# Altium footprint library LimeMicroAltiumLib_pcbLib_r05.PcbLib: 746 footprints (part 10 of 48)
Each footprint in its own frame and in the unit in brackets; x right, y up, seen from the top. Pads: shape width x height; smd on the part's side, far side on the other; paste and mask are expansions set on the pad; w line width, h text height; cw(c..) or ccw(c..) is an arc to the next point about the centre after c.
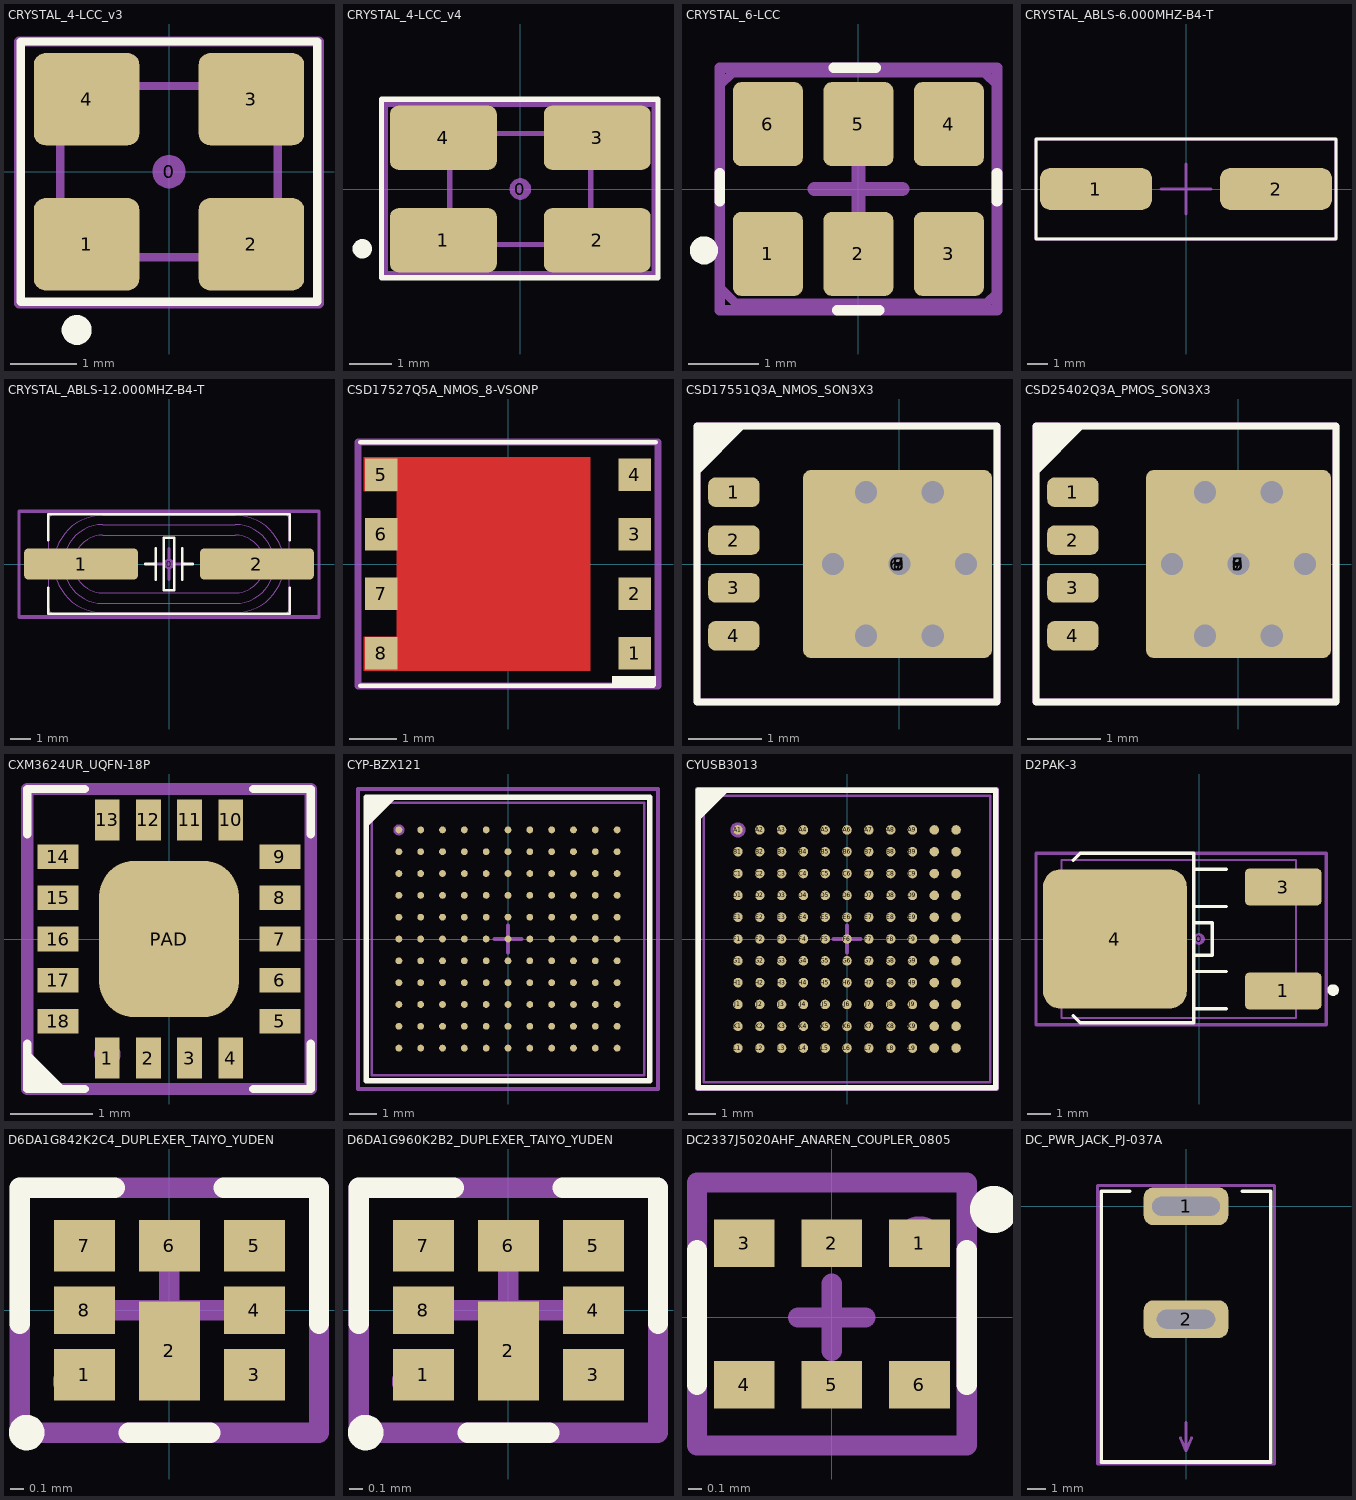
[diagram p9: the footprints below, top view; thin cyan lines are the x and y axes]

## CRYSTAL_4-LCC_v3 [mm] "SMD Crystal 4-lead leadless package"
height 0.8
pads (5):
  round 0.508 on Mech15: 0(0,0)
  rrect25% 1.6x1.4 smd: 1(-1.25,-1.1) 2(1.25,-1.1) 3(1.25,1.1) 4(-1.25,1.1)
Top Overlay:
  circle w0.254: c-1.4,-2.4 r0.1
  lines w0.127: -2.25,-1.975 2.25,-1.975 2.25,1.975 -2.25,1.975 -2.25,-1.975
Mechanical 13:
  lines w0.127: -1.65,-1.143 -1.65,1.143 -1.493,1.3 1.494,1.3 1.65,1.144 1.65,-1.143 1.493,-1.3 -1.493,-1.3 -1.65,-1.143
Mechanical 15:
  circle w0.35: c-1.5,-1.3 r0.141
  lines w0.15: -2.275,-2 -2.275,1.975 2.275,1.975 2.275,-2 -2.275,-2
  text ".Designator" at 0,0 h0.55
3D body "Crystal TXC Corp 7M series.STEP": height 0.8, standoff 0, extent -1.65,-1.3 1.65,1.3

## CRYSTAL_4-LCC_v4 [mm] "SMD Crystal 4-lead leadless package"
height 0.8
pads (5):
  round 0.508 on Mech15: 0(0,0)
  rrect25% 2.5x1.5 smd: 1(-1.8,-1.2) 2(1.8,-1.2) 3(1.8,1.2) 4(-1.8,1.2)
Top Overlay:
  circle w0.254: c-3.7,-1.4 r0.1
  lines w0.127: -3.25,-2.075 -3.25,2.1 3.225,2.1 3.225,-2.075 -3.25,-2.075
Mechanical 13:
  lines w0.127: -1.65,-1.143 -1.493,-1.3 1.493,-1.3 1.65,-1.143 1.65,1.144 1.494,1.3 -1.493,1.3 -1.65,1.143 -1.65,-1.143
Mechanical 15:
  circle w0.35: c-2.2,-1.3 r0.141
  lines w0.15: -3.175,-2 3.15,-2 3.15,2 -3.175,2 -3.175,-2
  text ".Designator" at 0,0 h0.55
3D body "User Library-Crystal.step": height 0.9, standoff -0.05, extent -2.5,-1.6 2.5,1.6

## CRYSTAL_6-LCC [mm] "SMD Crystal 6-lead leadless package"
height 0.8
pads (6):
  rrect25% 1x1.2 smd: 1(-1.29,-0.925) 2(0,-0.925) 3(1.29,-0.925) 4(1.29,0.925) 5(0,0.925) 6(-1.29,0.925)
Top Overlay:
  circle w0.2: c-2.2,-0.875 r0.1
  lines w0.15: -1.975,-0.175 -1.975,0.225 ; -0.35,1.725 0.25,1.725 ; -0.3,-1.725 0.3,-1.725 ; 1.975,-0.175 1.975,0.225
Mechanical 13:
  lines w0.127: -1.975,-1.4 -1.75,-1.625 1.825,-1.625 1.975,-1.475 1.975,1.475 1.8,1.65 -1.8,1.65 -1.975,1.475 -1.975,-1.4
Mechanical 15:
  lines w0.15: -1.975,-1.725 1.975,-1.725 1.975,1.725 -1.975,1.725 -1.975,-1.725
  lines w0.2: -0.625,0 0,0 ; 0,-0.625 0,0 ; 0,0.625 0,0 ; 0.625,0 0,0
  lines w0.3: -1.185,-0.907 ccw(c-1.279,-0.922) -1.184,-0.925
  text ".Designator" at 0,0 h0.55
3D body "User Library-SG310.SLDPRT": height 1.05, standoff 0, extent -1.6,-1.225 1.6,1.275

## CRYSTAL_ABLS-6.000MHZ-B4-T [mm]
pads (2):
  rrect50% 5.6x2.1 smd mask+0.05: 1(-4.5,0) 2(4.5,0)
Top Overlay:
  lines w0.15: -7.5,-2.5 7.5,-2.5 7.5,2.5 -7.5,2.5 -7.5,-2.5
Mechanical 15:
  lines w0.15: -1.25,0 0,0 ; 0,-1.25 0,0 ; 0,1.25 0,0 ; 1.25,0 0,0 ; -7.5,-2.5 7.5,-2.5 7.5,2.5 -7.5,2.5 -7.5,-2.5
  text ".Designator" at 0,0 h0.55
3D body "ABLS-6.000MHZ-B4-T--3DModel-STEP-400430.STEP": height 4.06, standoff -0.1, extent -6.35,-2.349 6.35,2.35

## CRYSTAL_ABLS-12.000MHZ-B4-T [mm] "SMD Crystal ABLS-12.000MHZ-B4-T package"
height 4.3
pads (3):
  round 0.508 on Mech14: 0(0,0)
  rrect25% 5.5x1.5 smd: 1(-4.25,0) 2(4.25,0)
Top Overlay:
  lines w0.127: -5.842,-1.143 -5.842,-2.413 5.842,-2.413 5.842,-1.143 ; -5.842,1.143 -5.842,2.413 5.842,2.413 5.842,1.143 ; -1.143,0 -0.635,0 ; -0.635,-0.762 -0.635,0.762 ; 0.635,-0.762 0.635,0.762 ; 0.635,0 1.143,0 ; -0.254,-1.27 0.254,-1.27 0.254,1.27 -0.254,1.27 -0.254,-1.27
Mechanical 13:
  lines w0.05: -5.8,-0.45 -6.4,-0.45 -6.4,0.45 -5.8,0.45 ; 5.8,-0.45 6.4,-0.45 6.4,0.45 5.8,0.45 ; -5.8,-2.165 ccw(c-5.55,-2.165) -5.55,-2.415 5.55,-2.415 ccw(c5.55,-2.165) 5.8,-2.165 5.8,2.165 ccw(c5.55,2.165) 5.55,2.415 -5.55,2.415 ccw(c-5.55,2.165) -5.8,2.165 -5.8,-2.165 ; -3.2,-2.35 cw(c-3.2,0) -3.2,2.35 3.2,2.35 cw(c3.2,0) 3.2,-2.35 -3.2,-2.35 ; -3.2,-1.9 cw(c-3.2,0) -3.2,1.9 3.2,1.9 cw(c3.2,0) 3.2,-1.9 -3.2,-1.9 ; -3.2,-1.4 cw(c-3.2,0) -3.2,1.4 3.2,1.4 cw(c3.2,0) 3.2,-1.4 -3.2,-1.4
Mechanical 14:
  lines w0.127: -7.239,-2.54 7.239,-2.54 7.239,2.54 -7.239,2.54 -7.239,-2.54
Mechanical 15:
  lines w0.15: -0.75,0 0,0 ; 0,-0.75 0,0 ; 0,0.75 0,0 ; 0.75,0 0,0 ; -7.25,-2.575 -7.25,2.55 7.25,2.55 7.25,-2.575 -7.25,-2.575
  text ".Designator" at 0,0 h0.55
3D body "Crystal HC49_US-SM.STEP": height 4.29, standoff -0.01, extent -6.4,-2.415 6.4,2.415

## CSD17527Q5A_NMOS_8-VSONP [mm]
height 1.7
pads (8):
  rect 0.7x0.7 smd: 1(2.705,-1.905) 2(2.705,-0.635) 3(2.705,0.635) 4(2.705,1.905) 5(-2.705,1.905) 6(-2.705,0.635) 7(-2.705,-0.635) 8(-2.705,-1.905)
Top Layer:
  region: -3.075,-1.55 -2.375,-1.55 -2.375,1.55 -3.075,1.55 -3.075,2.275 1.75,2.275 1.75,-2.275 -3.075,-2.275
Top Overlay:
  region: 3.15,-2.6 3.15,-2.4 2.225,-2.4 2.225,-2.6
  lines w0.1: -3.15,-2.6 3.1,-2.6 ; -3.15,2.6 3.15,2.6
Top Paste:
  region: -1.8,1.775 -1.8,0.275 -0.3,0.275 -0.3,1.775
  region: -1.8,-1.775 -1.8,-0.275 -0.3,-0.275 -0.3,-1.775
  region: 0.1,1.775 1.3,1.775 1.3,0.275 0.1,0.275
  region: 0.1,-1.775 1.3,-1.775 1.3,-0.275 0.1,-0.275
Top Solder:
  region: 1.85,-2.35 1.85,2.35 -2.45,2.35 -2.45,-2.35
Mechanical 15:
  circle w0.15: c2.7,-1.9 r0.075
  lines w0.15: -0.5,0 0.5,0 ; 0,-0.5 0,0.5 ; -3.2,-2.6 -3.2,2.6 3.2,2.6 3.2,-2.6 -3.2,-2.6
  text ".Designator" at 0,0 h0.55
3D body "User Library-VSON-8.step": height 1, standoff 0, extent -3.002,-2.5 3,2.5

## CSD17551Q3A_NMOS_SON3X3 [mm]
pads (9):
  rrect50% 0.7x0.4 smd paste-1000 mask+0.05: 1(-2.248,0.975) 2(-2.248,0.325) 3(-2.248,-0.325) 4(-2.248,-0.975)
  rrect8% 2.51x2.55 smd paste-1000 mask+0.05: 5(0,0) 6(-0.053,0) 7(0,0) 8(0,0) 9(0,0)
via -0.453,0.975 diameter 0.6 hole 0.3
via 0.452,0.975 diameter 0.6 hole 0.3
via -0.453,-0.975 diameter 0.6 hole 0.3
via 0.452,-0.975 diameter 0.6 hole 0.3
via -0.905,0 diameter 0.6 hole 0.3
via 0,0 diameter 0.6 hole 0.3
via 0.905,0 diameter 0.6 hole 0.3
Top Overlay:
  region: -2.75,1.875 -2.75,1.2 -2.075,1.875
  lines w0.1: -2.75,-1.875 1.325,-1.875 1.325,1.875 -2.75,1.875 -2.75,-1.875
Top Paste:
  drawing of 12 lines, arcs and shapes, not listed
Top Solder:
  drawing of 5 lines, arcs and shapes, not listed
Mechanical 15:
  circle w0.15: c-2.275,0.975 r0.056
  lines w0.1: -0.5,0 0,0 ; 0,-0.5 0,0 ; 0,0.5 0,0 ; 0.5,0 0,0 ; -2.75,-1.875 -2.75,1.875 1.325,1.875 1.325,-1.875 -2.75,-1.875
  text ".Designator" at 0,0 h0.55
3D body "Trans_Texas_Instruments_CSD17551Q3A_eec.STEP": height 0.25, standoff 0, extent -2.698,-1.875 1.302,1.875

## CSD25402Q3A_PMOS_SON3X3 [mm]
pads (9):
  rrect50% 0.7x0.4 smd paste-1000 mask+0.05: 1(-2.248,0.975) 2(-2.248,0.325) 3(-2.248,-0.325) 4(-2.248,-0.975)
  rrect8% 2.51x2.55 smd paste-1000 mask+0.05: 5(0,0) 6(0,0) 7(0,0) 8(0,0) 9(0,0)
via -0.453,0.975 diameter 0.6 hole 0.3
via 0.452,0.975 diameter 0.6 hole 0.3
via -0.453,-0.975 diameter 0.6 hole 0.3
via 0.452,-0.975 diameter 0.6 hole 0.3
via -0.905,0 diameter 0.6 hole 0.3
via 0,0 diameter 0.6 hole 0.3
via 0.905,0 diameter 0.6 hole 0.3
Top Overlay:
  region: -2.75,1.875 -2.75,1.2 -2.075,1.875
  lines w0.1: -2.75,-1.875 1.325,-1.875 1.325,1.875 -2.75,1.875 -2.75,-1.875
Top Paste:
  drawing of 12 lines, arcs and shapes, not listed
Top Solder:
  drawing of 5 lines, arcs and shapes, not listed
Mechanical 15:
  circle w0.15: c-2.275,0.975 r0.056
  lines w0.1: -0.5,0 0,0 ; 0,-0.5 0,0 ; 0,0.5 0,0 ; 0.5,0 0,0 ; -2.75,-1.875 -2.75,1.875 1.325,1.875 1.325,-1.875 -2.75,-1.875
  text ".Designator" at 0,0 h0.55
3D body "Trans_Texas_Instruments_CSD17551Q3A_eec.STEP": height 0.25, standoff 0, extent -2.698,-1.875 1.302,1.875

## CXM3624UR_UQFN-18P [mm]
pads (19):
  rect 0.3x0.5 smd mask+0.05: 1(-0.75,-1.45) 2(-0.25,-1.45) 3(0.25,-1.45) 4(0.75,-1.45) 10(0.75,1.45) 11(0.25,1.45) 12(-0.25,1.45) 13(-0.75,1.45)
  rect 0.5x0.3 smd mask+0.05: 5(1.35,-1) 6(1.35,-0.5) 7(1.35,0) 8(1.35,0.5) 9(1.35,1) 14(-1.35,1) 15(-1.35,0.5) 16(-1.35,0) 17(-1.35,-0.5) 18(-1.35,-1)
  rrect50% 1.7x1.9 smd paste-0.1 mask+0.05: PAD(0,0)
Top Overlay:
  region: -1.725,-1.35 -1.25,-1.825 -1.725,-1.825
  lines w0.1: -1.725,-1.275 -1.725,-1.825 -1.025,-1.825 ; -1.725,1.275 -1.725,1.825 -1.025,1.825 ; 1.025,-1.825 1.725,-1.825 1.725,-1.275 ; 1.025,1.825 1.725,1.825 1.725,1.275
Mechanical 15:
  circle w0.25: c-0.75,-1.4 r0.035
  lines w0.15: -0.5,0 0,0 ; 0,-0.5 0,0 ; 0,0.5 0,0 ; 0.5,0 0,0 ; -1.725,-1.825 -1.725,1.825 1.725,1.825 1.725,-1.825 -1.725,-1.825
  text ".Designator" at 0,0 h0.55
3D body: height 0.56, standoff 0, extent -1.198,-1.3 -0.8,-0.9
3D body: height 0.55, standoff 0, extent -1.4,-1.5 1.4,1.5

## CYP-BZX121 [mm] "BGA, 121-Balls, Body 10x10mm, Pitch 0.8mm"
height 1.2
pads (121):
  round 0.25 smd: A1(-4,4) A2(-3.2,4) A3(-2.4,4) A4(-1.6,4) A5(-0.8,4) A6(0,4) A7(0.8,4) A8(1.6,4) A9(2.4,4) A10(3.2,4) A11(4,4) B1(-4,3.2) B2(-3.2,3.2) B3(-2.4,3.2) B4(-1.6,3.2) B5(-0.8,3.2) B6(0,3.2) B7(0.8,3.2) B8(1.6,3.2) B9(2.4,3.2) B10(3.2,3.2) B11(4,3.2) C1(-4,2.4) C2(-3.2,2.4) C3(-2.4,2.4) C4(-1.6,2.4) C5(-0.8,2.4) C6(0,2.4) C7(0.8,2.4) C8(1.6,2.4) C9(2.4,2.4) C10(3.2,2.4) C11(4,2.4) D1(-4,1.6) D2(-3.2,1.6) D3(-2.4,1.6) D4(-1.6,1.6) D5(-0.8,1.6) D6(0,1.6) D7(0.8,1.6) D8(1.6,1.6) D9(2.4,1.6) D10(3.2,1.6) D11(4,1.6) E1(-4,0.8) E2(-3.2,0.8) E3(-2.4,0.8) E4(-1.6,0.8) E5(-0.8,0.8) E6(0,0.8) E7(0.8,0.8) E8(1.6,0.8) E9(2.4,0.8) E10(3.2,0.8) E11(4,0.8) F1(-4,0) F2(-3.2,0) F3(-2.4,0) F4(-1.6,0) F5(-0.8,0) F6(0,0) F7(0.8,0) F8(1.6,0) F9(2.4,0) F10(3.2,0) F11(4,0) G1(-4,-0.8) G2(-3.2,-0.8) G3(-2.4,-0.8) G4(-1.6,-0.8) G5(-0.8,-0.8) G6(0,-0.8) G7(0.8,-0.8) G8(1.6,-0.8) G9(2.4,-0.8) G10(3.2,-0.8) G11(4,-0.8) H1(-4,-1.6) H2(-3.2,-1.6) H3(-2.4,-1.6) H4(-1.6,-1.6) H5(-0.8,-1.6) H6(0,-1.6) H7(0.8,-1.6) H8(1.6,-1.6) H9(2.4,-1.6) H10(3.2,-1.6) H11(4,-1.6) J1(-4,-2.4) J2(-3.2,-2.4) J3(-2.4,-2.4) J4(-1.6,-2.4) J5(-0.8,-2.4) J6(0,-2.4) J7(0.8,-2.4) J8(1.6,-2.4) J9(2.4,-2.4) J10(3.2,-2.4) J11(4,-2.4) K1(-4,-3.2) K2(-3.2,-3.2) K3(-2.4,-3.2) K4(-1.6,-3.2) K5(-0.8,-3.2) K6(0,-3.2) K7(0.8,-3.2) K8(1.6,-3.2) K9(2.4,-3.2) K10(3.2,-3.2) K11(4,-3.2) L1(-4,-4) L2(-3.2,-4) L3(-2.4,-4) L4(-1.6,-4) L5(-0.8,-4) L6(0,-4) L7(0.8,-4) L8(1.6,-4) L9(2.4,-4) L10(3.2,-4) L11(4,-4)
Top Overlay:
  region: -4.2,5.2 -5.2,4.2 -5.2,5.2
  lines w0.2: -5.2,4.2 -4.2,5.2 ; -5.2,-5.2 -5.2,5.2 5.2,5.2 5.2,-5.2 -5.2,-5.2
Mechanical 13:
  lines w0.1: -5,-5 -5,5 5,5 5,-5 -5,-5
Mechanical 15:
  circle w0.2: c-4,4 r0.1
  lines w0.15: -0.5,0 0.5,0 ; 0,-0.5 0,0.5 ; -5.5,-5.5 -5.5,5.5 5.5,5.5 5.5,-5.5 -5.5,-5.5
  text ".Designator" at 0,0 h0.55
3D body: height 1.2, standoff 0.15, extent -5,-5 5,5
3D body: height 1.3, standoff 1.2, extent -4.4,3.6 -3.6,4.4

## CYUSB3013 [mm] "BGA, 121-Leads, Body 10,50x10,50mmx1,10mm, Pitch 0,80mm"
height 1.1
pads (121):
  round 0.35 smd: A1(-4,4) A2(-3.2,4) A3(-2.4,4) A4(-1.6,4) A5(-0.8,4) A6(0,4) A7(0.8,4) A8(1.6,4) A9(2.4,4) A10(3.2,4) A11(4,4) B1(-4,3.2) B2(-3.2,3.2) B3(-2.4,3.2) B4(-1.6,3.2) B5(-0.8,3.2) B6(0,3.2) B7(0.8,3.2) B8(1.6,3.2) B9(2.4,3.2) B10(3.2,3.2) B11(4,3.2) C1(-4,2.4) C2(-3.2,2.4) C3(-2.4,2.4) C4(-1.6,2.4) C5(-0.8,2.4) C6(0,2.4) C7(0.8,2.4) C8(1.6,2.4) C9(2.4,2.4) C10(3.2,2.4) C11(4,2.4) D1(-4,1.6) D2(-3.2,1.6) D3(-2.4,1.6) D4(-1.6,1.6) D5(-0.8,1.6) D6(0,1.6) D7(0.8,1.6) D8(1.6,1.6) D9(2.4,1.6) D10(3.2,1.6) D11(4,1.6) E1(-4,0.8) E2(-3.2,0.8) E3(-2.4,0.8) E4(-1.6,0.8) E5(-0.8,0.8) E6(0,0.8) E7(0.8,0.8) E8(1.6,0.8) E9(2.4,0.8) E10(3.2,0.8) E11(4,0.8) F1(-4,0) F2(-3.2,0) F3(-2.4,0) F4(-1.6,0) F5(-0.8,0) F6(0,0) F7(0.8,0) F8(1.6,0) F9(2.4,0) F10(3.2,0) F11(4,0) G1(-4,-0.8) G2(-3.2,-0.8) G3(-2.4,-0.8) G4(-1.6,-0.8) G5(-0.8,-0.8) G6(0,-0.8) G7(0.8,-0.8) G8(1.6,-0.8) G9(2.4,-0.8) G10(3.2,-0.8) G11(4,-0.8) H1(-4,-1.6) H2(-3.2,-1.6) H3(-2.4,-1.6) H4(-1.6,-1.6) H5(-0.8,-1.6) H6(0,-1.6) H7(0.8,-1.6) H8(1.6,-1.6) H9(2.4,-1.6) H10(3.2,-1.6) H11(4,-1.6) J1(-4,-2.4) J2(-3.2,-2.4) J3(-2.4,-2.4) J4(-1.6,-2.4) J5(-0.8,-2.4) J6(0,-2.4) J7(0.8,-2.4) J8(1.6,-2.4) J9(2.4,-2.4) J10(3.2,-2.4) J11(4,-2.4) K1(-4,-3.2) K2(-3.2,-3.2) K3(-2.4,-3.2) K4(-1.6,-3.2) K5(-0.8,-3.2) K6(0,-3.2) K7(0.8,-3.2) K8(1.6,-3.2) K9(2.4,-3.2) K10(3.2,-3.2) K11(4,-3.2) L1(-4,-4) L2(-3.2,-4) L3(-2.4,-4) L4(-1.6,-4) L5(-0.8,-4) L6(0,-4) L7(0.8,-4) L8(1.6,-4) L9(2.4,-4) L10(3.2,-4) L11(4,-4)
Top Overlay:
  region: -4.45,5.45 -5.45,4.45 -5.45,5.45
  lines w0.2: -5.45,4.45 -4.45,5.45 ; -5.45,-5.45 -5.45,5.45 5.45,5.45 5.45,-5.45 -5.45,-5.45
Mechanical 13:
  lines w0.1: -5.25,-5.25 -5.25,5.25 5.25,5.25 5.25,-5.25 -5.25,-5.25
Mechanical 15:
  circle w0.35: c-4,4 r0.1
  lines w0.15: -0.5,0 0.5,0 ; 0,-0.5 0,0.5 ; -5.5,-5.5 -5.5,5.5 5.5,5.5 5.5,-5.5 -5.5,-5.5
  text ".Designator" at 0,0 h0.55
3D body: height 1.11, standoff 1, extent -4.397,3.601 -3.6,4.399
3D body: height 1.1, standoff 0.25, extent -5.25,-5.25 5.25,5.25

## D2PAK-3 [mm] "D-PAK/TO-263-3; 3 Leads (1 Cropped); Body 14.7 (inc. leads) x 10.2 mm (LxW max)"
height 4.572
pads (4):
  round 0.508 on Mech15: 0(0,0)
  rrect25% 3.3x1.6 smd: 1(3.626,-2.24) 3(3.626,2.24)
  rrect25% 6.2x6 smd: 4(-3.626,0)
Top Overlay:
  circle w0.25: c5.774,-2.2 r0.125
  lines w0.15: -5.426,-3.3 -5.126,-3.6 -0.225,-3.6 -0.225,3.7 -5.126,3.7 -5.426,3.4 ; 1.174,-3 -0.226,-3 -0.226,-1.4 1.174,-1.4 ; 1.174,1.4 -0.226,1.4 -0.226,3 1.174,3 ; -0.226,-0.7 0.574,-0.7 0.574,0.7 -0.226,0.7 -0.226,-0.7
Mechanical 13:
  lines w0.076: -5.928,-3.4 -5.928,3.4 4.174,3.4 4.174,-3.4 -5.928,-3.4
Mechanical 15:
  circle w0.3: c3.674,-2.2 r0.1
  lines w0.15: -7.026,-3.7 5.474,-3.7 5.474,3.7 -7.026,3.7 -7.026,-3.7
  text ".Designator" at 0,0 h0.55
3D body "User Library-DPAK_TO-252AA.step": height 2.37, standoff -0.03, extent -5.928,-3.367 4.172,3.367

## D6DA1G842K2C4_DUPLEXER_TAIYO_YUDEN [mm]
pads (8):
  rect 0.45x0.38 smd mask+0.05: 1(-0.625,-0.475) 3(0.625,-0.475) 5(0.625,0.475) 6(0,0.475) 7(-0.625,0.475)
  rect 0.45x0.73 smd mask+0.05: 2(0,-0.3)
  rect 0.45x0.35 smd mask+0.05: 4(0.625,0) 8(-0.625,0)
Top Overlay:
  circle w0.15: c-1.05,-0.9 r0.056
  lines w0.15: -1.1,-0.1 -1.1,0.9 -0.4,0.9 ; -0.3,-0.9 0.3,-0.9 ; 0.4,0.9 1.1,0.9 1.1,-0.1
Top Solder:
  region: -0.9,0.715 -0.9,-0.715 0.9,-0.715 0.9,0.715
Mechanical 13:
  region: -0.15,-0.6 -0.15,-0.025 0.15,-0.025 0.15,-0.6
  region: 0.775,-0.6 0.775,-0.37 0.475,-0.37 0.475,-0.6
  region: 0.775,-0.14 0.775,0.09 0.475,0.09 0.475,-0.14
  region: 0.775,0.32 0.775,0.55 0.475,0.55 0.475,0.32
  region: -0.15,0.32 -0.15,0.55 0.15,0.55 0.15,0.32
  region: -0.775,0.32 -0.775,0.55 -0.475,0.55 -0.475,0.32
  region: -0.775,-0.14 -0.775,0.09 -0.475,0.09 -0.475,-0.14
  region: -0.775,-0.6 -0.775,-0.37 -0.475,-0.37 -0.475,-0.6
Mechanical 15:
  circle w0.15: c-0.725,-0.525 r0.056
  lines w0.15: -0.4,0 0,0 ; 0,-0.4 0,0 ; 0,0.4 0,0 ; 0.4,0 0,0 ; -1.1,-0.9 -1.1,0.9 1.1,0.9 1.1,-0.9 -1.1,-0.9
  text ".Designator" at 0,0 h0.55
3D body: height 0.57, standoff 0, extent -0.9,-0.7 0.9,0.7
3D body: height 0.59, standoff 0, extent -0.724,-0.57 -0.525,-0.37

## D6DA1G960K2B2_DUPLEXER_TAIYO_YUDEN [mm]
pads (8):
  rect 0.45x0.38 smd mask+0.05: 1(-0.625,-0.475) 3(0.625,-0.475) 5(0.625,0.475) 6(0,0.475) 7(-0.625,0.475)
  rect 0.45x0.73 smd mask+0.05: 2(0,-0.3)
  rect 0.45x0.35 smd mask+0.05: 4(0.625,0) 8(-0.625,0)
Top Overlay:
  circle w0.15: c-1.05,-0.9 r0.056
  lines w0.15: -1.1,-0.1 -1.1,0.9 -0.4,0.9 ; -0.3,-0.9 0.3,-0.9 ; 0.4,0.9 1.1,0.9 1.1,-0.1
Top Solder:
  region: -0.9,0.715 -0.9,-0.715 0.9,-0.715 0.9,0.715
Mechanical 13:
  region: -0.775,-0.6 -0.775,-0.37 -0.475,-0.37 -0.475,-0.6
  region: -0.775,-0.14 -0.775,0.09 -0.475,0.09 -0.475,-0.14
  region: -0.775,0.32 -0.775,0.55 -0.475,0.55 -0.475,0.32
  region: -0.15,0.32 -0.15,0.55 0.15,0.55 0.15,0.32
  region: 0.775,0.32 0.775,0.55 0.475,0.55 0.475,0.32
  region: 0.775,-0.14 0.775,0.09 0.475,0.09 0.475,-0.14
  region: 0.775,-0.6 0.775,-0.37 0.475,-0.37 0.475,-0.6
  region: -0.15,-0.6 -0.15,-0.025 0.15,-0.025 0.15,-0.6
Mechanical 15:
  circle w0.15: c-0.725,-0.525 r0.056
  lines w0.15: -0.4,0 0,0 ; 0,-0.4 0,0 ; 0,0.4 0,0 ; 0.4,0 0,0 ; -1.1,-0.9 1.1,-0.9 1.1,0.9 -1.1,0.9 -1.1,-0.9
  text ".Designator" at 0,0 h0.55
3D body: height 0.59, standoff 0, extent -0.724,-0.57 -0.525,-0.37
3D body: height 0.57, standoff 0, extent -0.9,-0.7 0.9,0.7

## DC2337J5020AHF_ANAREN_COUPLER_0805 [mm]
pads (6):
  rect 0.45x0.35 smd mask+0.05: 1(0.65,0.55) 2(0,0.55) 3(-0.65,0.55) 4(-0.65,-0.5) 5(0,-0.5) 6(0.65,-0.5)
Top Overlay:
  circle w0.3: c1.2,0.8 r0.025
  lines w0.15: -1,-0.5 -1,0.5 ; 1,-0.5 1,0.5
Mechanical 15:
  circle w0.3: c0.65,0.575 r0.025
  lines w0.15: -0.25,0 0.25,0 ; 0,-0.25 0,0.25 ; -1,-0.95 -1,1 1,1 1,-0.95 -1,-0.95
  text ".Designator" at 0,0 h0.55
3D body: height 0.6, standoff 0, extent -1,-0.6 1,0.6
3D body: height 0.6, standoff 0, extent 0.463,-0.075 0.663,0.15

## DC_PWR_JACK_PJ-037A [mm]
pads (2):
  rrect50% 4.5x2 hole 1 slot 3.6 at 0 deg mask+0.05: 1(0,0)
  rrect50% 4.5x2 hole 1 slot 3.1 at 0 deg mask+0.05: 2(0,-6)
Top Overlay:
  lines w0.2: -3,0.8 -4.5,0.8 -4.5,-13.6 4.5,-13.6 4.5,0.8 3,0.8
Mechanical 15:
  lines w0.15: -0.3,-12.3 0,-13 ; 0,-11.5 0,-13 ; 0.3,-12.3 0,-13 ; -4.7,-13.7 4.7,-13.7 4.7,1.1 -4.7,1.1 -4.7,-13.7
  text "board edge" at -2.6,-11.1 h0.55
  text ".Designator" at 0,0 h0.55
3D body "CUI_PJ-037A.step": height 11, standoff -3.5, extent -4.5,-13.7 4.5,0.8